# Altium footprint library mitosis.PcbLib: 11 footprints
Each footprint in its own frame and in the unit in brackets; x right, y up, seen from the top. Pads: shape width x height; smd on the part's side, far side on the other; paste and mask are expansions set on the pad; w line width, h text height; cw(c..) or ccw(c..) is an arc to the next point about the centre after c.
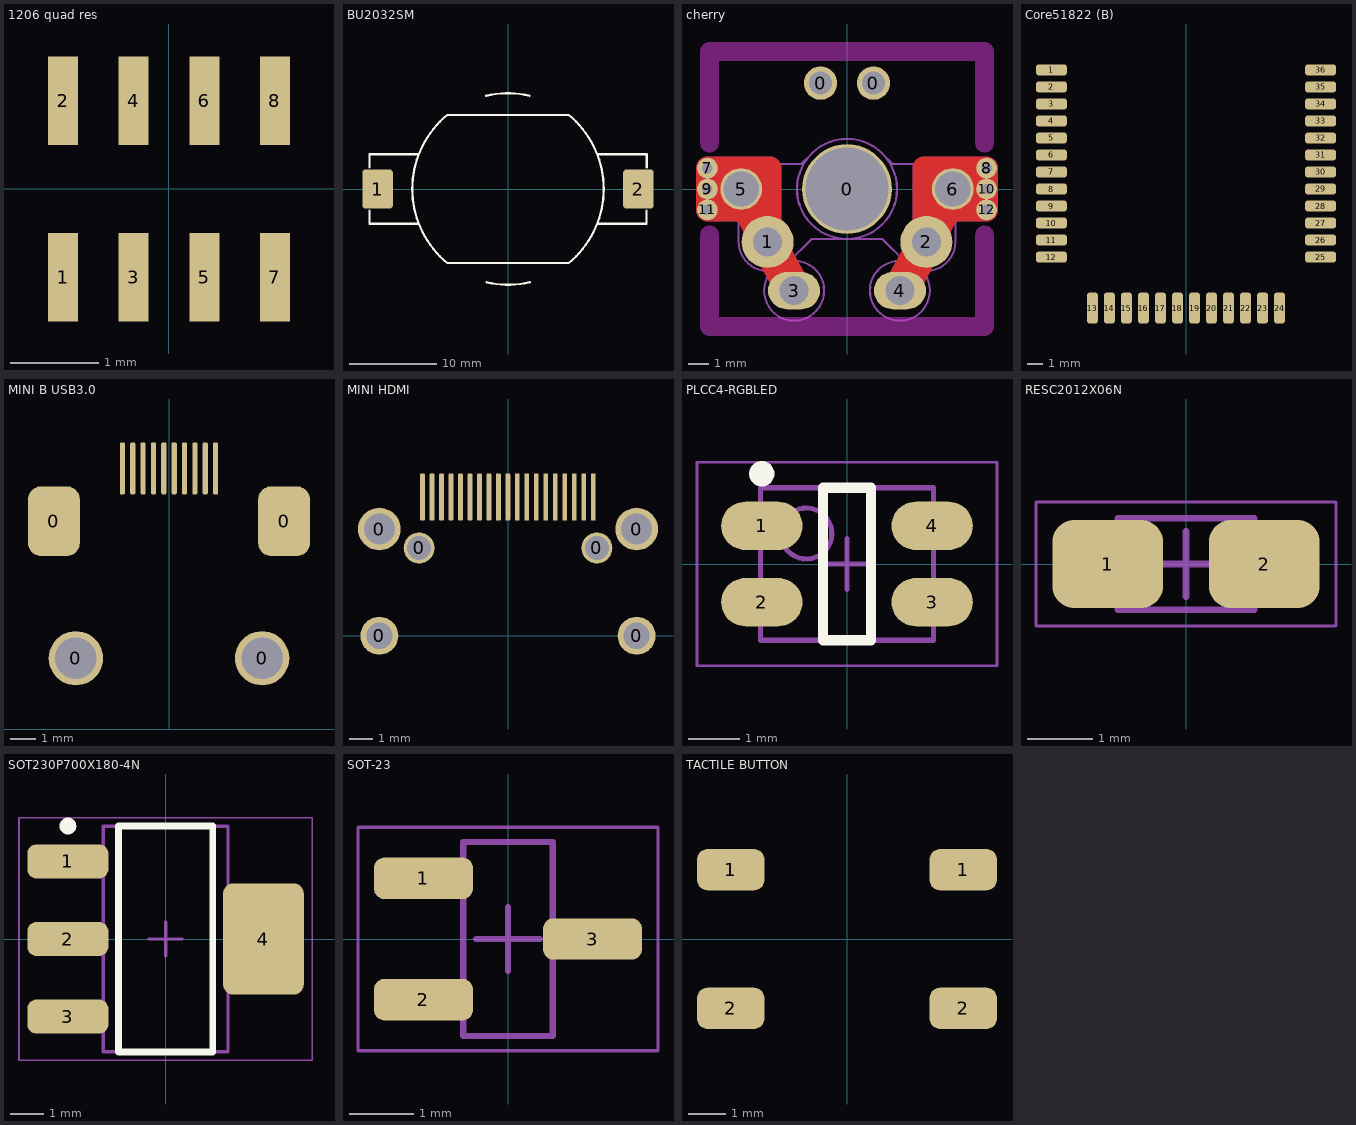
[diagram p0: the footprints below, top view; thin cyan lines are the x and y axes]

## 1206 quad res [mm]
pads (8):
  rect 0.34x1 smd: 1(-1.2,-1) 2(-1.2,1) 3(-0.4,-1) 4(-0.4,1) 5(0.4,-1) 6(0.4,1) 7(1.2,-1) 8(1.2,1)
3D body: height 1.1, standoff 0, extent -1.6,-0.8 1.6,0.8

## BU2032SM [mm] "Battery holder"
pads (2):
  rrect20% 3.5x4.5 smd paste-100: 1(-15,0) 2(15,0)
Top Overlay:
  lines w0.254: -15.93,-2.5 -15.93,-4 -10.287,-4 ; -15.93,2.5 -15.93,4 -10.287,4 ; -2.505,10.723 cw(c0,0) 2.483,10.728 ; -2.483,-10.728 ccw(c0,0) 2.505,-10.723 ; 10.287,-4 15.93,-4 15.93,-2.5 ; 10.287,4 15.95,4 15.95,2.5 ; -7,-8.5 cw(c0,0) -7,8.5 7,8.5 cw(c0,0) 7,-8.5 -7,-8.5
Top Paste:
  rectangle: 13.55,-2 14.87,-0.1
  rectangle: 13.55,0.1 14.87,2
  region: 16.45,2 15.13,2 15.13,0.1 16.45,0.1
  region: 16.45,-0.1 15.13,-0.1 15.13,-2 16.45,-2
  region: -13.55,2 -14.87,2 -14.87,0.1 -13.55,0.1
  region: -13.55,-0.1 -14.87,-0.1 -14.87,-2 -13.55,-2
  rectangle: -16.45,0.1 -15.13,2
  rectangle: -16.45,-2 -15.13,-0.1
3D body: height 4.6, standoff 0, extent -7,-8.5 7,8.5
3D body: height 4.7, standoff 1.5, extent -9.921,-9.98 10,9.98
3D body: height 4.6, standoff 0, extent -15.9,-4 15.9,4

## cherry [mm]
pads (15):
  round 1.6 hole 1.1: 0(-1.27,5.08) 0(1.27,5.08)
  round 4.3 hole 3.988: 0(0,0)
  round 2.5 hole 1.4: 1(-3.81,-2.54) 2(3.81,-2.54)
  oval 2.5x1.8 hole 1.4: 3(-2.54,-4.877) 4(2.54,-4.877)
  round 2 hole 1.702: 5(-5.08,0) 6(5.08,0)
  round 1 hole 0.5 mask+0.05: 7(-6.7,1) 8(6.7,1) 9(-6.7,0) 10(6.7,0) 11(-6.7,-1) 12(6.7,-1)
Top Layer:
  lines w1.1: -6.7,0 -5.08,0 ; -4.3,-1 -6.7,-1 -6.7,1 -3.7,1 -3.7,-1.9 ; 3.7,-1.9 3.7,1 6.7,1 6.7,-1 4.3,-1 ; 5.08,0 6.7,0
  lines w1.7: -5.08,0 -3.81,-2.54 -2.54,-4.877 ; 2.54,-4.877 3.81,-2.54 5.08,0
Bottom Layer:
  lines w1.1: -6.7,0 -5.08,0 ; -4.3,-1 -6.7,-1 -6.7,1 -3.7,1 -3.7,-1.9 ; 3.7,-1.9 3.7,1 6.7,1 6.7,-1 4.3,-1 ; 5.08,0 6.7,0
  lines w1.7: -5.08,0 -3.81,-2.54 -2.54,-4.877 ; 2.54,-4.877 3.81,-2.54 5.08,0
Keep-Out Layer:
  board cut-out: -7,2.2 -7.008,6.6 -6.977,6.756 -6.888,6.888 -6.756,6.977 -6.6,7.008 -6.6,7 6.6,7.008 6.756,6.977 6.888,6.888 6.977,6.756 7.008,6.6 7,6.6 7.008,2.2 6.977,2.044 6.888,1.912 6.756,1.823 6.6,1.792 6.444,1.823 6.312,1.912 6.223,2.044 6.192,2.2 6.2,2.2 6.2,6.2 -6.2,6.2 -6.192,2.2 -6.223,2.044 -6.312,1.912 -6.444,1.823 -6.6,1.792 -6.756,1.823 -6.888,1.912 -6.977,2.044 -7.008,2.2
  board cut-out: -7,-2.2 -7.008,-6.6 -6.977,-6.756 -6.888,-6.888 -6.756,-6.977 -6.6,-7.008 -6.6,-7 6.6,-7.008 6.756,-6.977 6.888,-6.888 6.977,-6.756 7.008,-6.6 7,-6.6 7.008,-2.2 6.977,-2.044 6.888,-1.912 6.756,-1.823 6.6,-1.792 6.444,-1.823 6.312,-1.912 6.223,-2.044 6.192,-2.2 6.2,-2.2 6.2,-6.2 -6.2,-6.2 -6.192,-2.2 -6.223,-2.044 -6.312,-1.912 -6.444,-1.823 -6.6,-1.792 -6.756,-1.823 -6.888,-1.912 -6.977,-2.044 -7.008,-2.2
  lines w0.1: -7,-6.6 ccw(c-6.6,-6.6) -6.6,-7 6.6,-7 ccw(c6.6,-6.6) 7,-6.6 7,-2.2 ccw(c6.6,-2.2) 6.2,-2.2 6.2,-6.2 -6.2,-6.2 -6.2,-2.2 ccw(c-6.6,-2.2) -7,-2.2 -7,-6.6 ; -7,2.2 ccw(c-6.6,2.2) -6.2,2.2 -6.2,6.2 6.2,6.2 6.2,2.2 ccw(c6.6,2.2) 7,2.2 7,6.6 ccw(c6.6,6.6) 6.6,7 -6.6,7 ccw(c-6.6,6.6) -7,6.6 -7,2.2
  text "CUTOUT" at -1.7,6.3 h0.6
  text "CUTOUT" at -1.7,-6.9 h0.6
Mechanical 3:
  circle w0.1: c-2.54,-4.877 r1.44
  circle w0.1: c-5.08,0 r1.22
  lines w0.1: 0,-2.4 cw(c0,0.002) 1.7,1.7 2.2,1.2 5.1,1.2 cw(c5.054,-0.02) 5.9,-0.9 5.2,-1.6 5.2,-2.519 cw(c3.808,-2.54) 2.8,-3.5 1.7,-2.4 0,-2.4
Mechanical 7:
  circle w0.1: c2.54,-4.877 r1.44
  circle w0.1: c5.08,0 r1.22
  lines w0.1: -5.9,-0.9 cw(c-5.054,-0.02) -5.1,1.2 -2.2,1.2 -1.7,1.7 cw(c0,0.002) 0,-2.4 -1.7,-2.4 -2.8,-3.5 cw(c-3.808,-2.54) -5.2,-2.519 -5.2,-1.6 -5.9,-0.9
3D body: height 23, standoff 11.5, extent -9,-9 9,9
3D body: height 14.9, standoff -3, extent -7.82,-8.165 7.82,8.165
3D body: height 23, standoff 11.5, extent -9,-9 9,9
3D body: height 14.9, standoff -3, extent -7.82,-8.165 7.82,8.165
3D body: height 23, standoff 11.5, extent -9,-9 9,9

## Core51822 (B) [mm]
pads (36):
  rrect50% 2x0.7 smd: 1(-8.7,-5.6) 2(-8.7,-6.7) 3(-8.7,-7.8) 4(-8.7,-8.9) 5(-8.7,-10) 6(-8.7,-11.1) 7(-8.7,-12.2) 8(-8.7,-13.3) 9(-8.7,-14.4) 10(-8.7,-15.5) 11(-8.7,-16.6) 12(-8.7,-17.7) 25(8.7,-17.7) 26(8.7,-16.6) 27(8.7,-15.5) 28(8.7,-14.4) 29(8.7,-13.3) 30(8.7,-12.2) 31(8.7,-11.1) 32(8.7,-10) 33(8.7,-8.9) 34(8.7,-7.8) 35(8.7,-6.7) 36(8.7,-5.6)
  rrect50% 0.7x2 smd: 13(-6.05,-21) 14(-4.95,-21) 15(-3.85,-21) 16(-2.75,-21) 17(-1.65,-21) 18(-0.55,-21) 19(0.55,-21) 20(1.65,-21) 21(2.75,-21) 22(3.85,-21) 23(4.95,-21) 24(6.05,-21)
3D body: height 1, standoff 0, extent -8.5,-20.8 8.5,0
3D body: height 1.8, standoff 1, extent -2.3,-13.8 3.7,-7.8

## MINI B USB3.0 [mm] "USB2070"
pads (14):
  rrect50% 2x2.7 smd mask+0.05: 0(-4.45,8.05) 0(4.45,8.05)
  round 2.1 hole 1.6: 0(-3.6,2.75) 0(3.6,2.75)
  rrect50% 0.2x2 smd mask+0.05: 1(-1.8,10.09) 2(-1.4,10.09) 3(-1,10.09) 4(-0.6,10.09) 5(-0.2,10.09) 6(0.2,10.09) 7(0.6,10.09) 8(1,10.09) 9(1.4,10.09) 10(1.8,10.09)
3D body: height 3.75, standoff -0.65, extent -4.85,0 4.85,9.9

## MINI HDMI [mm]
pads (25):
  round 1.6 hole 1.1: 0(-5.425,0) 0(5.425,0)
  round 1.8 hole 1.3: 0(-5.425,4.5) 0(5.425,4.5)
  round 1.3 hole 1 mask+0.05: 0(-3.75,3.7) 0(3.75,3.7)
  rrect50% 0.2x2 smd mask+0.05: 1(3.595,5.85) 2(3.195,5.85) 3(2.795,5.85) 4(2.395,5.85) 5(1.995,5.85) 6(1.595,5.85) 7(1.195,5.85) 8(0.795,5.85) 9(0.395,5.85) 10(-0.005,5.85) 11(-0.405,5.85) 12(-0.805,5.85) 13(-1.205,5.85) 14(-1.605,5.85) 15(-2.005,5.85) 16(-2.405,5.85) 17(-2.805,5.85) 18(-3.205,5.85) 19(-3.605,5.85)
3D body: height 3.3, standoff -2.15, extent -5.625,-2 5.625,5.902

## PLCC4-RGBLED [mm]
height 2.1
pads (4):
  oval 1.6x0.95 smd: 1(-1.675,0.75) 2(-1.675,-0.75) 3(1.675,-0.75) 4(1.675,0.75)
Top Overlay:
  circle w0.25: c-1.675,1.775 r0.125
  lines w0.2: -0.475,-1.5 0.475,-1.5 0.475,1.5 -0.475,1.5 -0.475,-1.5
Mechanical 13:
  circle w0.1: c-0.8,0.6 r0.5
  lines w0.1: -1.7,-1.5 1.7,-1.5 1.7,1.5 -1.7,1.5 -1.7,-1.5
Mechanical 15:
  lines w0.05: -2.95,-2 2.95,-2 2.95,2 -2.95,2 -2.95,-2
  lines w0.1: -0.5,0 0.5,0 ; 0,-0.5 0,0.5
3D body: height 2.1, standoff 0, extent -1.7,-1.5 1.7,1.5
3D body: height 2.2, standoff 0, extent -0.992,-0.998 1,0.998

## RESC2012X06N [mm] "Chip Resistor, 2-Leads, Body 2.00x1.25mm, IPC Medium Density"
height 0.55
pads (2):
  rrect50% 1.7x1.35 smd: 1(-1.2,0) 2(1.2,0)
Mechanical 13:
  lines w0.1: -1.05,-0.7 1.05,-0.7 1.05,0.7 -1.05,0.7 -1.05,-0.7
Mechanical 15:
  lines w0.05: -2.3,-0.95 2.3,-0.95 2.3,0.95 -2.3,0.95 -2.3,-0.95
  lines w0.1: -0.5,0 0.5,0 ; 0,-0.5 0,0.5
3D body: height 0.55, standoff 0, extent 0.6,-0.7 1.05,0.7
3D body: height 0.55, standoff 0, extent -1.05,-0.7 -0.6,0.7
3D body: height 0.55, standoff 0, extent -0.6,-0.7 0.6,0.7

## SOT230P700X180-4N [mm] "SOT223, 4-Leads, Body 6.50x7.00mm (avg), Pitch 2.30mm, IPC Medium Density"
height 1.8
pads (4):
  rrect50% 2.4x1 smd: 1(-2.9,2.3) 2(-2.9,0) 3(-2.9,-2.3)
  rrect25% 2.4x3.3 smd: 4(2.9,0)
Top Overlay:
  circle w0.25: c-2.9,3.35 r0.125
  lines w0.2: -1.4,-3.35 -1.4,3.35 1.4,3.35 1.4,-3.35 -1.4,-3.35
Mechanical 13:
  lines w0.1: -1.85,-3.35 -1.85,3.35 1.85,3.35 1.85,-3.35 -1.85,-3.35
Mechanical 15:
  lines w0.05: -4.35,-3.6 -4.35,3.6 4.35,3.6 4.35,-3.6 -4.35,-3.6
  lines w0.1: -0.5,0 0.5,0 ; 0,-0.5 0,0.5
3D body: height 1.8, standoff 0.02, extent -1.85,-3.35 1.85,3.35

## SOT-23 [mm] "SOT23, 3-Leads, Body 2.92x3.10mm, Pitch 0.95mm, IPC Medium Density"
height 1.12
pads (3):
  rrect50% 1.55x0.65 smd: 1(-1.325,0.95) 2(-1.325,-0.95) 3(1.325,0)
Mechanical 13:
  lines w0.1: -0.7,-1.52 -0.7,1.52 0.7,1.52 0.7,-1.52 -0.7,-1.52
Mechanical 15:
  lines w0.05: -2.35,-1.75 -2.35,1.75 2.35,1.75 2.35,-1.75 -2.35,-1.75
  lines w0.1: -0.5,0 0.5,0 ; 0,-0.5 0,0.5
3D body: height 1.12, standoff 0.01, extent -0.7,-1.52 0.7,1.52

## TACTILE BUTTON [mm]
pads (4):
  rrect50% 1.8x1.1 smd: 1(-3.1,1.85) 1(3.1,1.85) 2(-3.1,-1.85) 2(3.1,-1.85)
3D body: height 1.2, standoff 0, extent -2.6,-2.6 2.6,2.6
3D body: height 1.6, standoff 0, extent -1.091,-1.098 1.1,1.098